# Altium footprint library MainFPs.PcbLib: 215 footprints (part 4 of 14)
Each footprint in its own frame and in the unit in brackets; x right, y up, seen from the top. Pads: shape width x height; smd on the part's side, far side on the other; paste and mask are expansions set on the pad; w line width, h text height; cw(c..) or ccw(c..) is an arc to the next point about the centre after c.
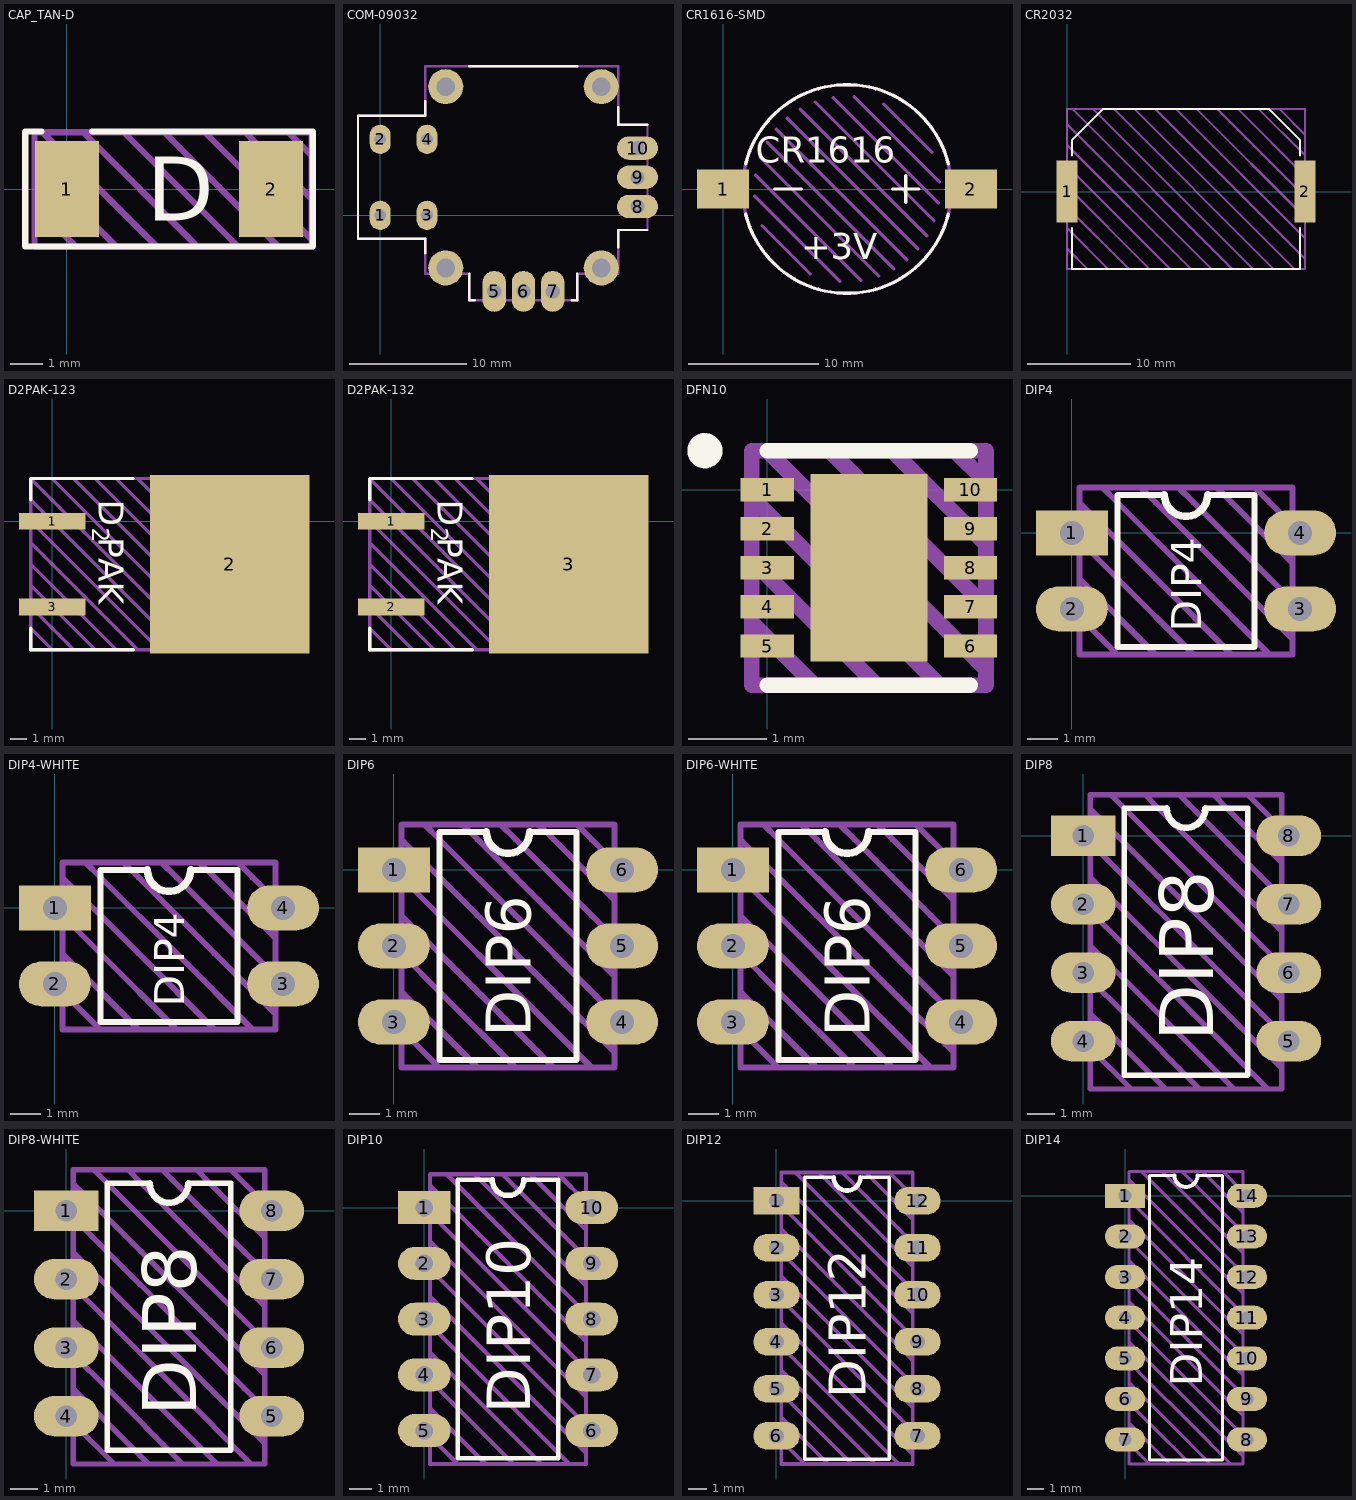
[diagram p3: the footprints below, top view; thin cyan lines are the x and y axes]

## CAP_TAN-D [mm]
pads (2):
  rect 2x3 smd: 1(0,0) 2(6.4,0)
Top Overlay:
  lines w0.2: -0.8,1.8 -1.3,1.8 -1.3,-1.8 7.7,-1.8 7.7,1.8 0.8,1.8
  text "D" at 2.5,-1 h2
Top Draw:
  lines w0.2: -1.016,-0.508 0.276,-1.8 0.508,-1.8 ; -1.016,0.762 1.546,-1.8 1.778,-1.8 ; -0.762,1.778 2.794,-1.778 ; 0.508,1.778 4.086,-1.8 4.318,-1.8 ; 1.778,1.778 5.334,-1.778 ; 3.048,1.778 6.626,-1.8 7.112,-1.8 ; 4.318,1.778 7.678,-1.582 ; 5.588,1.778 7.678,-0.312 ; 6.604,1.778 6.938,1.778 7.689,1.027 ; 7.678,-1.582 7.678,-1.778 7.656,-1.8 -0.994,-1.8 -1.016,-1.778 -1.016,1.778 7.678,1.778 7.678,-1.582
Top Info:
  text "'.Comment'" at -1.049,-3.383 h1
3D body: height 1.8, standoff 0.05, extent -0.2,-1.15 -0.1,1.15
3D body: height 0.05, standoff 0, extent -0.2,-1.15 0.769,1.15
3D body: height 2.9, standoff 0.05, extent -0.1,-1.5 1.5,1.5
3D body: height 2.9, standoff 0.05, extent 1.5,-1.5 6.5,1.5
3D body: height 0.05, standoff 0, extent 5.631,-1.15 6.6,1.15
3D body: height 1.8, standoff 0.05, extent 6.5,-1.15 6.6,1.15

## COM-09032 [mm] "PS3/PS4 Analog Joystick"
pads (14):
  oval 1.8x2.5 hole 1: 1(0,0) 2(0,6.5) 3(4,0) 4(4,6.5)
  oval 2x3.5 hole 1.2: 5(9.75,-6.5) 6(12.25,-6.5) 7(14.75,-6.5)
  oval 3.5x2 hole 1.2: 8(22,0.75) 9(22,3.25) 10(22,5.75)
  round 3 hole 1.6: ""(5.6,-4.5) ""(5.6,11) ""(18.9,-4.5) ""(18.9,11)
Top Overlay:
  lines w0.2: 3.85,-3.25 3.85,-2 -1.9,-2 -1.9,8.5 3.85,8.5 3.85,9.75 ; 7.6,-5 7.6,-7.25 8.1,-7.25 ; 7.6,12.75 16.85,12.75 ; 16.35,-7.25 16.85,-7.25 16.85,-5 ; 20.35,-2.75 20.35,-1.25 22.85,-1.25 ; 20.35,9.25 20.35,7.75 22.85,7.75
Top Draw:
  lines w0.2: -1.9,-2 -1.9,8.5 3.85,8.5 3.85,12.75 7.6,12.75 20.35,12.75 20.35,7.75 22.85,7.75 22.85,-1.25 20.35,-1.25 20.35,-5 16.85,-5 16.85,-7.25 7.6,-7.25 7.6,-5 3.85,-5 3.85,-2 -1.9,-2
Top Info:
  text "'.Comment'" at 2.003,-11.166 h2

## CR1616-SMD [mm]
pads (2):
  rect 4x3 smd: 1(0,0) 2(19,0)
Top Overlay:
  lines w0.25: 1.739,-1.94 ccw(c9.5,0) 17.261,-1.94 ; 1.739,1.94 cw(c9.5,0) 17.261,1.94 ; 3.968,0 6,0 ; 12.984,0 15.016,0 ; 14,-1.016 14,1.016
  text "CR1616" at 2.5,2 h2
  text "+3V" at 6,-5.4 h2
Top Draw:
  circle w0.25: c9.5,0 r8
  lines w0.25: 2.422,-0.559 8.941,-7.078 ; 2.482,1.078 10.578,-7.018 ; 2.828,2.429 11.929,-6.672 ; 2.982,-2.816 6.684,-6.518 ; 3.371,3.584 13.084,-6.129 ; 4.073,4.578 14.078,-5.427 ; 4.922,5.427 14.927,-4.578 ; 5.916,6.129 15.629,-3.584 ; 7.071,6.672 16.172,-2.429 ; 8.422,7.018 16.518,-1.078 ; 10.059,7.078 16.578,0.559 ; 12.316,6.518 16.018,2.816
Top Info:
  text "'.Comment'" at 1.003,-10.666 h2
3D body "cr1616.stp": height 2.1, standoff 0, extent -1.5,-8.095 20.6,8.1

## CR2032 [mm] "Battery Holder Compact"
pads (2):
  rect 2x6 smd: 1(0,0) 2(23,0)
Top Overlay:
  lines w0.2: 0.5,-3.5 0.5,-7.5 22.5,-7.5 22.5,-3.5 ; 0.5,3.5 0.5,5 ; 22.5,3.5 22.5,5 19.5,8 3.5,8 0.5,5 ; 0.5,5 0.5,5
Top Draw:
  lines w0.2: 0,-5.5 2,-7.5 ; 0,-3.5 4,-7.5 ; 0,-1.5 6,-7.5 ; 0,0.5 8,-7.5 ; 0,2.5 10,-7.5 ; 0,4.5 12,-7.5 ; 0,6.5 14,-7.5 ; 0.5,8 16,-7.5 ; 2.5,8 18,-7.5 ; 4.5,8 20,-7.5 ; 6.5,8 22,-7.5 ; 8.5,8 23,-6.5 ; 10.5,8 23,-4.5 ; 12.5,8 23,-2.5 ; 14.5,8 23,-0.5 ; 16.5,8 23,1.5 ; 18.5,8 23,3.5 ; 20.5,8 23,5.5 ; 0,-7.5 0,8 23,8 23,-7.5 0,-7.5
Top Info:
  text "'.Comment'" at 2.603,-10.866 h2
3D body "CR2032_Holder.STEP": height 4.35, standoff 0.05, extent 0.05,-7.625 22.95,7.888

## D2PAK-123 [mm]
height 4.6
pads (3):
  rect 3.95x1 smd: 1(0,0) 3(0,-5.08)
  rect 9.5x10.6 smd: 2(10.541,-2.54)
Top Overlay:
  lines w0.2: -1.27,-6.35 -1.27,-7.62 4.826,-7.62 ; -1.27,1.27 -1.27,2.54 4.826,2.54
  text "2" at 2.379,-0.383 h1
  text "D PAK" at 2.762,1.27 h1.5
Top Draw:
  lines w0.2: -1.27,-6.35 0,-7.62 ; -1.27,-5.08 1.27,-7.62 ; -1.27,-3.81 2.54,-7.62 ; -1.27,-2.54 3.81,-7.62 ; -1.27,-1.27 5.08,-7.62 ; -1.27,0 6.35,-7.62 ; -1.27,1.27 7.62,-7.62 ; 0,2.54 10.16,-7.62 ; 1.27,2.54 11.43,-7.62 ; 2.54,2.54 12.7,-7.62 ; 3.81,2.54 13.97,-7.62 ; 5.08,2.54 14.097,-6.477 ; 6.35,2.54 14.097,-5.207 ; 7.62,2.54 14.097,-3.937 ; 8.89,-7.62 -1.27,2.54 ; 8.89,2.54 14.097,-2.667 ; 10.16,2.54 14.097,-1.397 ; 11.43,2.54 14.097,-0.127 ; 12.7,2.54 14.097,1.143 ; -1.27,2.54 14.097,2.54 14.097,-7.62 -1.27,-7.62 -1.27,2.54
Top Info:
  text "'.Comment'" at 1.339,-9.979 h1.25
3D body "D2PAK.step": height 4.7, standoff 0, extent -1.329,-7.69 14.096,2.61

## D2PAK-132 [mm]
height 4.6
pads (3):
  rect 3.95x1 smd: 1(0,0) 2(0,-5.08)
  rect 9.5x10.6 smd: 3(10.541,-2.54)
Top Overlay:
  lines w0.2: -1.27,-6.35 -1.27,-7.62 4.826,-7.62 ; -1.27,1.27 -1.27,2.54 4.826,2.54
  text "2" at 2.379,-0.383 h1
  text "D PAK" at 2.762,1.27 h1.5
Top Draw:
  lines w0.2: -1.27,-6.35 0,-7.62 ; -1.27,-5.08 1.27,-7.62 ; -1.27,-3.81 2.54,-7.62 ; -1.27,-2.54 3.81,-7.62 ; -1.27,-1.27 5.08,-7.62 ; -1.27,0 6.35,-7.62 ; -1.27,1.27 7.62,-7.62 ; 0,2.54 10.16,-7.62 ; 1.27,2.54 11.43,-7.62 ; 2.54,2.54 12.7,-7.62 ; 3.81,2.54 13.97,-7.62 ; 5.08,2.54 14.097,-6.477 ; 6.35,2.54 14.097,-5.207 ; 7.62,2.54 14.097,-3.937 ; 8.89,-7.62 -1.27,2.54 ; 8.89,2.54 14.097,-2.667 ; 10.16,2.54 14.097,-1.397 ; 11.43,2.54 14.097,-0.127 ; 12.7,2.54 14.097,1.143 ; -1.27,2.54 14.097,2.54 14.097,-7.62 -1.27,-7.62 -1.27,2.54
Top Info:
  text "'.Comment'" at 1.339,-9.979 h1.25
3D body "D2PAK.step": height 4.7, standoff 0, extent -1.329,-7.69 14.096,2.61

## DFN10 [mm]
pads (11):
  rect 0.68x0.3 smd: 1(0,0) 2(0,-0.5) 3(0,-1) 4(0,-1.5) 5(0,-2) 6(2.6,-2) 7(2.6,-1.5) 8(2.6,-1) 9(2.6,-0.5) 10(2.6,0)
  rect 1.5x2.4 smd: ""(1.3,-1)
Top Overlay:
  circle w0.25: c-0.8,0.5 r0.1
  lines w0.2: 0,-2.5 2.6,-2.5 ; 0,0.5 2.6,0.5
Top Draw:
  lines w0.2: -0.2,-1.7 0.6,-2.5 ; -0.2,-0.9 1.4,-2.5 ; -0.2,-0.1 2.2,-2.5 ; 0,0.5 2.8,-2.3 ; 0.8,0.5 2.8,-1.5 ; 1.6,0.5 2.8,-0.7 ; 2.4,0.5 2.8,0.1 ; -0.2,-2.5 -0.2,0.5 2.8,0.5 2.8,-2.5 -0.2,-2.5
Top Info:
  text "'.Comment'" at -0.824,-3.292 h0.5
3D body "PSON50P300X100_HS-11N.step": height 1, standoff 0, extent -0.201,-2.5 2.801,0.5

## DIP4 [mm]
pads (4):
  rect 2.4x1.5 hole 0.8: 1(0,0)
  oval 2.4x1.5 hole 0.8: 2(0,-2.54) 3(7.62,-2.54) 4(7.62,0)
Top Overlay:
  lines w0.2: 3.048,1.27 1.524,1.27 1.524,-3.81 6.096,-3.81 6.096,1.27 4.572,1.27
  lines w0.25: 3.092,1.27 ccw(c3.81,1.27) 4.528,1.27
  text "DIP4" at 4.318,-3.302 h1
Top Draw:
  lines w0.2: 0.254,-2.794 1.524,-4.064 ; 0.254,-1.524 2.794,-4.064 ; 0.254,-0.254 1.524,-1.524 4.064,-4.064 ; 0.254,1.016 2.794,-1.524 5.334,-4.064 ; 3.556,1.524 4.064,1.016 6.604,-1.524 7.366,-2.286 ; 4.826,1.524 5.334,1.016 7.366,-1.016 ; 6.096,1.524 6.604,1.016 7.366,0.254 ; 6.604,-4.064 4.064,-1.524 1.524,1.016 1.016,1.524 2.286,1.524 2.794,1.016 5.334,-1.524 7.366,-3.556 ; 0.254,-4.064 0.254,1.524 7.366,1.524 7.366,-4.064 0.254,-4.064
Top Info:
  text "'.Comment'" at -0.381,-5.461 h1
3D body: height 2, standoff 0.25, extent 0.508,-3.81 7.112,1.27
3D body: height 3, standoff 2, extent 0.508,-3.81 7.112,1.27
3D body: height 2.09, standoff 0.31, extent -0.127,-0.5 0.508,0.5
3D body: height 0.38, standoff -3, extent -0.127,-0.254 0.127,0.254
3D body: height 2.09, standoff 0.31, extent -0.127,-3.04 0.508,-2.04
3D body: height 0.38, standoff -3, extent -0.127,-2.794 0.127,-2.286
3D body: height 2.09, standoff 0.31, extent 7.112,-3.04 7.747,-2.04
3D body: height 0.38, standoff -3, extent 7.493,-2.794 7.747,-2.286
3D body: height 2.09, standoff 0.31, extent 7.112,-0.5 7.747,0.5
3D body: height 0.38, standoff -3, extent 7.493,-0.254 7.747,0.254

## DIP4-WHITE [mm]
pads (4):
  rect 2.4x1.5 hole 0.8: 1(0,0)
  oval 2.4x1.5 hole 0.8: 2(0,-2.54) 3(7.62,-2.54) 4(7.62,0)
Top Overlay:
  lines w0.2: 3.048,1.27 1.524,1.27 1.524,-3.81 6.096,-3.81 6.096,1.27 4.572,1.27
  lines w0.25: 3.092,1.27 ccw(c3.81,1.27) 4.528,1.27
  text "DIP4" at 4.318,-3.302 h1
Top Draw:
  lines w0.2: 0.254,-2.794 1.524,-4.064 ; 0.254,-1.524 2.794,-4.064 ; 0.254,-0.254 1.524,-1.524 4.064,-4.064 ; 0.254,1.016 2.794,-1.524 5.334,-4.064 ; 3.556,1.524 4.064,1.016 6.604,-1.524 7.366,-2.286 ; 4.826,1.524 5.334,1.016 7.366,-1.016 ; 6.096,1.524 6.604,1.016 7.366,0.254 ; 6.604,-4.064 4.064,-1.524 1.524,1.016 1.016,1.524 2.286,1.524 2.794,1.016 5.334,-1.524 7.366,-3.556 ; 0.254,-4.064 7.366,-4.064 7.366,1.524 0.254,1.524 0.254,-4.064
Top Info:
  text "'.Comment'" at -0.381,-5.461 h1
3D body: height 0.38, standoff -3, extent 7.493,-0.254 7.747,0.254
3D body: height 2.09, standoff 0.31, extent 7.112,-0.5 7.747,0.5
3D body: height 0.38, standoff -3, extent 7.493,-2.794 7.747,-2.286
3D body: height 2.09, standoff 0.31, extent 7.112,-3.04 7.747,-2.04
3D body: height 0.38, standoff -3, extent -0.127,-2.794 0.127,-2.286
3D body: height 2.09, standoff 0.31, extent -0.127,-3.04 0.508,-2.04
3D body: height 0.38, standoff -3, extent -0.127,-0.254 0.127,0.254
3D body: height 2.09, standoff 0.31, extent -0.127,-0.5 0.508,0.5
3D body: height 3, standoff 2, extent 0.508,-3.81 7.112,1.27
3D body: height 2, standoff 0.25, extent 0.508,-3.81 7.112,1.27

## DIP6 [mm]
pads (6):
  rect 2.4x1.5 hole 0.8: 1(0,0)
  oval 2.4x1.5 hole 0.8: 2(0,-2.54) 3(0,-5.08) 4(7.62,-5.08) 5(7.62,-2.54) 6(7.62,0)
Top Overlay:
  lines w0.2: 3.048,1.27 1.524,1.27 1.524,-6.35 6.096,-6.35 6.096,1.27 4.572,1.27
  lines w0.25: 3.092,1.27 ccw(c3.81,1.27) 4.528,1.27
  text "DIP6" at 4.572,-5.588 h1.5
Top Draw:
  lines w0.2: 0.254,-5.334 1.524,-6.604 ; 0.254,-4.064 2.794,-6.604 ; 0.254,-2.794 1.524,-4.064 4.064,-6.604 ; 0.254,-1.524 2.794,-4.064 5.334,-6.604 ; 0.254,-0.254 1.524,-1.524 4.064,-4.064 6.604,-6.604 ; 0.254,1.016 2.794,-1.524 5.334,-4.064 7.366,-6.096 ; 3.556,1.524 4.064,1.016 6.604,-1.524 7.366,-2.286 ; 4.826,1.524 5.334,1.016 7.366,-1.016 ; 6.096,1.524 6.604,1.016 7.366,0.254 ; 7.366,-4.826 6.604,-4.064 4.064,-1.524 1.524,1.016 1.016,1.524 2.286,1.524 2.794,1.016 5.334,-1.524 7.366,-3.556 ; 0.254,-6.604 7.366,-6.604 7.366,1.524 0.254,1.524 0.254,-6.604
Top Info:
  text "'.Comment'" at -0.381,-8.001 h1
3D body: height 0.38, standoff -3, extent 7.493,-0.254 7.747,0.254
3D body: height 2.09, standoff 0.31, extent 7.112,-0.5 7.747,0.5
3D body: height 0.38, standoff -3, extent 7.493,-2.794 7.747,-2.286
3D body: height 2.09, standoff 0.31, extent 7.112,-3.04 7.747,-2.04
3D body: height 0.38, standoff -3, extent 7.493,-5.334 7.747,-4.826
3D body: height 2.09, standoff 0.31, extent 7.112,-5.58 7.747,-4.58
3D body: height 0.38, standoff -3, extent -0.127,-5.334 0.127,-4.826
3D body: height 2.09, standoff 0.31, extent -0.127,-5.58 0.508,-4.58
3D body: height 0.38, standoff -3, extent -0.127,-2.794 0.127,-2.286
3D body: height 2.09, standoff 0.31, extent -0.127,-3.04 0.508,-2.04
3D body: height 0.38, standoff -3, extent -0.127,-0.254 0.127,0.254
3D body: height 2.09, standoff 0.31, extent -0.127,-0.5 0.508,0.5
3D body: height 3, standoff 2, extent 0.508,-6.35 7.112,1.27
3D body: height 2, standoff 0.25, extent 0.508,-6.35 7.112,1.27

## DIP6-WHITE [mm]
pads (6):
  rect 2.4x1.5 hole 0.8: 1(0,0)
  oval 2.4x1.5 hole 0.8: 2(0,-2.54) 3(0,-5.08) 4(7.62,-5.08) 5(7.62,-2.54) 6(7.62,0)
Top Overlay:
  lines w0.2: 3.048,1.27 1.524,1.27 1.524,-6.35 6.096,-6.35 6.096,1.27 4.572,1.27
  lines w0.25: 3.092,1.27 ccw(c3.81,1.27) 4.528,1.27
  text "DIP6" at 4.572,-5.588 h1.5
Top Draw:
  lines w0.2: 0.254,-5.334 1.524,-6.604 ; 0.254,-4.064 2.794,-6.604 ; 0.254,-2.794 1.524,-4.064 4.064,-6.604 ; 0.254,-1.524 2.794,-4.064 5.334,-6.604 ; 0.254,-0.254 1.524,-1.524 4.064,-4.064 6.604,-6.604 ; 0.254,1.016 2.794,-1.524 5.334,-4.064 7.366,-6.096 ; 3.556,1.524 4.064,1.016 6.604,-1.524 7.366,-2.286 ; 4.826,1.524 5.334,1.016 7.366,-1.016 ; 6.096,1.524 6.604,1.016 7.366,0.254 ; 7.366,-4.826 6.604,-4.064 4.064,-1.524 1.524,1.016 1.016,1.524 2.286,1.524 2.794,1.016 5.334,-1.524 7.366,-3.556 ; 0.254,-6.604 0.254,1.524 7.366,1.524 7.366,-6.604 0.254,-6.604
Top Info:
  text "'.Comment'" at -0.381,-8.001 h1
3D body: height 2, standoff 0.25, extent 0.508,-6.35 7.112,1.27
3D body: height 3, standoff 2, extent 0.508,-6.35 7.112,1.27
3D body: height 2.09, standoff 0.31, extent -0.127,-0.5 0.508,0.5
3D body: height 0.38, standoff -3, extent -0.127,-0.254 0.127,0.254
3D body: height 2.09, standoff 0.31, extent -0.127,-3.04 0.508,-2.04
3D body: height 0.38, standoff -3, extent -0.127,-2.794 0.127,-2.286
3D body: height 2.09, standoff 0.31, extent -0.127,-5.58 0.508,-4.58
3D body: height 0.38, standoff -3, extent -0.127,-5.334 0.127,-4.826
3D body: height 2.09, standoff 0.31, extent 7.112,-5.58 7.747,-4.58
3D body: height 0.38, standoff -3, extent 7.493,-5.334 7.747,-4.826
3D body: height 2.09, standoff 0.31, extent 7.112,-3.04 7.747,-2.04
3D body: height 0.38, standoff -3, extent 7.493,-2.794 7.747,-2.286
3D body: height 2.09, standoff 0.31, extent 7.112,-0.5 7.747,0.5
3D body: height 0.38, standoff -3, extent 7.493,-0.254 7.747,0.254

## DIP8 [mm]
pads (8):
  rect 2.4x1.5 hole 0.8: 1(0,0)
  oval 2.4x1.5 hole 0.8: 2(0,-2.54) 3(0,-5.08) 4(0,-7.62) 5(7.62,-7.62) 6(7.62,-5.08) 7(7.62,-2.54) 8(7.62,0)
Top Overlay:
  lines w0.2: 3.048,1.016 1.524,1.016 1.524,-8.89 6.096,-8.89 6.096,1.016 4.572,1.016
  lines w0.25: 3.092,1.016 ccw(c3.81,1.016) 4.528,1.016
  text "DIP8" at 4.826,-7.62 h2
Top Draw:
  lines w0.2: 0.254,-7.874 1.778,-9.398 ; 0.254,-6.604 3.048,-9.398 ; 0.254,-5.334 1.524,-6.604 4.318,-9.398 ; 0.254,-4.064 2.794,-6.604 5.588,-9.398 ; 0.254,-2.794 1.524,-4.064 4.064,-6.604 6.858,-9.398 ; 0.254,-1.524 2.794,-4.064 5.334,-6.604 7.366,-8.636 ; 0.254,-0.254 1.524,-1.524 4.064,-4.064 6.604,-6.604 7.366,-7.366 ; 0.254,1.016 2.794,-1.524 5.334,-4.064 7.366,-6.096 ; 1.016,1.524 1.524,1.016 4.064,-1.524 6.604,-4.064 7.366,-4.826 ; 2.286,1.524 2.794,1.016 5.334,-1.524 7.366,-3.556 ; 3.556,1.524 4.064,1.016 6.604,-1.524 7.366,-2.286 ; 4.826,1.524 5.334,1.016 7.366,-1.016 ; 6.096,1.524 6.604,1.016 7.366,0.254 ; 0.254,-9.398 7.366,-9.398 7.366,1.524 0.254,1.524 0.254,-9.398
Top Info:
  text "'.Comment'" at -0.381,-10.795 h1
3D body: height 2.09, standoff 0.31, extent -0.127,-5.58 0.508,-4.58
3D body: height 0.38, standoff -3, extent -0.127,-5.334 0.127,-4.826
3D body: height 2.09, standoff 0.31, extent -0.127,-8.12 0.508,-7.12
3D body: height 0.38, standoff -3, extent -0.127,-7.874 0.127,-7.366
3D body: height 2.09, standoff 0.31, extent 7.112,-8.12 7.747,-7.12
3D body: height 0.38, standoff -3, extent 7.493,-7.874 7.747,-7.366
3D body: height 2.09, standoff 0.31, extent 7.112,-5.58 7.747,-4.58
3D body: height 0.38, standoff -3, extent 7.493,-5.334 7.747,-4.826
3D body: height 2.09, standoff 0.31, extent -0.127,-0.5 0.508,0.5
3D body: height 0.38, standoff -3, extent -0.127,-0.254 0.127,0.254
3D body: height 2.09, standoff 0.31, extent -0.127,-3.04 0.508,-2.04
3D body: height 0.38, standoff -3, extent -0.127,-2.794 0.127,-2.286
3D body: height 2.09, standoff 0.31, extent 7.112,-3.04 7.747,-2.04
3D body: height 0.38, standoff -3, extent 7.493,-2.794 7.747,-2.286
3D body: height 2.09, standoff 0.31, extent 7.112,-0.5 7.747,0.5
3D body: height 0.38, standoff -3, extent 7.493,-0.254 7.747,0.254
3D body: height 3, standoff 2, extent 0.508,-8.89 7.112,1.27
3D body: height 2.03, standoff 0.25, extent 0.508,-8.89 7.112,1.27

## DIP8-WHITE [mm]
pads (8):
  rect 2.4x1.5 hole 0.8: 1(0,0)
  oval 2.4x1.5 hole 0.8: 2(0,-2.54) 3(0,-5.08) 4(0,-7.62) 5(7.62,-7.62) 6(7.62,-5.08) 7(7.62,-2.54) 8(7.62,0)
Top Overlay:
  lines w0.2: 3.048,1.016 1.524,1.016 1.524,-8.89 6.096,-8.89 6.096,1.016 4.572,1.016
  lines w0.25: 3.092,1.016 ccw(c3.81,1.016) 4.528,1.016
  text "DIP8" at 4.826,-7.62 h2
Top Draw:
  lines w0.2: 0.254,-7.874 1.778,-9.398 ; 0.254,-6.604 3.048,-9.398 ; 0.254,-5.334 1.524,-6.604 4.318,-9.398 ; 0.254,-4.064 2.794,-6.604 5.588,-9.398 ; 0.254,-2.794 1.524,-4.064 4.064,-6.604 6.858,-9.398 ; 0.254,-1.524 2.794,-4.064 5.334,-6.604 7.366,-8.636 ; 0.254,-0.254 1.524,-1.524 4.064,-4.064 6.604,-6.604 7.366,-7.366 ; 0.254,1.016 2.794,-1.524 5.334,-4.064 7.366,-6.096 ; 1.016,1.524 1.524,1.016 4.064,-1.524 6.604,-4.064 7.366,-4.826 ; 2.286,1.524 2.794,1.016 5.334,-1.524 7.366,-3.556 ; 3.556,1.524 4.064,1.016 6.604,-1.524 7.366,-2.286 ; 4.826,1.524 5.334,1.016 7.366,-1.016 ; 6.096,1.524 6.604,1.016 7.366,0.254 ; 0.254,-9.398 0.254,1.524 7.366,1.524 7.366,-9.398 0.254,-9.398
Top Info:
  text "'.Comment'" at -0.381,-10.795 h1
3D body: height 2.03, standoff 0.25, extent 0.508,-8.89 7.112,1.27
3D body: height 3, standoff 2, extent 0.508,-8.89 7.112,1.27
3D body: height 0.38, standoff -3, extent 7.493,-0.254 7.747,0.254
3D body: height 2.09, standoff 0.31, extent 7.112,-0.5 7.747,0.5
3D body: height 0.38, standoff -3, extent 7.493,-2.794 7.747,-2.286
3D body: height 2.09, standoff 0.31, extent 7.112,-3.04 7.747,-2.04
3D body: height 0.38, standoff -3, extent -0.127,-2.794 0.127,-2.286
3D body: height 2.09, standoff 0.31, extent -0.127,-3.04 0.508,-2.04
3D body: height 0.38, standoff -3, extent -0.127,-0.254 0.127,0.254
3D body: height 2.09, standoff 0.31, extent -0.127,-0.5 0.508,0.5
3D body: height 0.38, standoff -3, extent 7.493,-5.334 7.747,-4.826
3D body: height 2.09, standoff 0.31, extent 7.112,-5.58 7.747,-4.58
3D body: height 0.38, standoff -3, extent 7.493,-7.874 7.747,-7.366
3D body: height 2.09, standoff 0.31, extent 7.112,-8.12 7.747,-7.12
3D body: height 0.38, standoff -3, extent -0.127,-7.874 0.127,-7.366
3D body: height 2.09, standoff 0.31, extent -0.127,-8.12 0.508,-7.12
3D body: height 0.38, standoff -3, extent -0.127,-5.334 0.127,-4.826
3D body: height 2.09, standoff 0.31, extent -0.127,-5.58 0.508,-4.58

## DIP10 [mm]
pads (10):
  rect 2.4x1.5 hole 0.8: 1(0,0)
  oval 2.4x1.5 hole 0.8: 2(0,-2.54) 3(0,-5.08) 4(0,-7.62) 5(0,-10.16) 6(7.62,-10.16) 7(7.62,-7.62) 8(7.62,-5.08) 9(7.62,-2.54) 10(7.62,0)
Top Overlay:
  lines w0.2: 3.048,1.27 1.524,1.27 1.524,-11.43 6.096,-11.43 6.096,1.27 4.572,1.27
  lines w0.25: 3.092,1.27 ccw(c3.81,1.27) 4.528,1.27
  text "DIP10" at 4.826,-9.398 h2
Top Draw:
  lines w0.2: 0.254,-10.414 1.524,-11.684 ; 0.254,-9.144 2.794,-11.684 ; 0.254,-7.874 4.064,-11.684 ; 0.254,-6.604 5.334,-11.684 ; 0.254,-5.334 6.604,-11.684 ; 0.254,-4.064 7.366,-11.176 ; 0.254,-2.794 7.366,-9.906 ; 0.254,-1.524 7.366,-8.636 7.366,-7.366 0.254,-0.254 0.254,1.016 7.366,-6.096 7.366,-4.826 1.016,1.524 2.286,1.524 7.366,-3.556 7.366,-2.286 3.556,1.524 4.826,1.524 7.366,-1.016 7.366,0.254 6.096,1.524 ; 0.254,-11.684 0.254,1.524 7.366,1.524 7.366,-11.684 0.254,-11.684
Top Info:
  text "'.Comment'" at -0.381,-13.081 h1
3D body: height 2.03, standoff 0.25, extent 0.508,-11.43 7.112,1.27
3D body: height 3, standoff 2, extent 0.508,-11.43 7.112,1.27
3D body: height 0.38, standoff -3, extent 7.493,-0.254 7.747,0.254
3D body: height 2.09, standoff 0.31, extent 7.112,-0.5 7.747,0.5
3D body: height 0.38, standoff -3, extent 7.493,-2.794 7.747,-2.286
3D body: height 2.09, standoff 0.31, extent 7.112,-3.04 7.747,-2.04
3D body: height 0.38, standoff -3, extent -0.127,-2.794 0.127,-2.286
3D body: height 2.09, standoff 0.31, extent -0.127,-3.04 0.508,-2.04
3D body: height 0.38, standoff -3, extent -0.127,-0.254 0.127,0.254
3D body: height 2.09, standoff 0.31, extent -0.127,-0.5 0.508,0.5
3D body: height 0.38, standoff -3, extent 7.493,-5.334 7.747,-4.826
3D body: height 2.09, standoff 0.31, extent 7.112,-5.58 7.747,-4.58
3D body: height 0.38, standoff -3, extent 7.493,-7.874 7.747,-7.366
3D body: height 2.09, standoff 0.31, extent 7.112,-8.12 7.747,-7.12
3D body: height 0.38, standoff -3, extent -0.127,-7.874 0.127,-7.366
3D body: height 2.09, standoff 0.31, extent -0.127,-8.12 0.508,-7.12
3D body: height 0.38, standoff -3, extent -0.127,-5.334 0.127,-4.826
3D body: height 2.09, standoff 0.31, extent -0.127,-5.58 0.508,-4.58
3D body: height 0.38, standoff -3, extent 7.493,-10.414 7.747,-9.906
3D body: height 2.09, standoff 0.31, extent 7.112,-10.66 7.747,-9.66
3D body: height 0.38, standoff -3, extent -0.127,-10.414 0.127,-9.906
3D body: height 2.09, standoff 0.31, extent -0.127,-10.66 0.508,-9.66

## DIP12 [mm]
pads (12):
  rect 2.5x1.5 hole 0.8: 1(0,0)
  oval 2.5x1.5 hole 0.8: 2(0,-2.54) 3(0,-5.08) 4(0,-7.62) 5(0,-10.16) 6(0,-12.7) 7(7.62,-12.7) 8(7.62,-10.16) 9(7.62,-7.62) 10(7.62,-5.08) 11(7.62,-2.54) 12(7.62,0)
Top Overlay:
  lines w0.2: 3.048,1.27 1.524,1.27 1.524,-13.97 6.096,-13.97 6.096,1.27 4.572,1.27
  lines w0.25: 3.092,1.27 ccw(c3.81,1.27) 4.528,1.27
  text "DIP12" at 4.826,-10.668 h2
Top Draw:
  lines w0.2: 0.254,-12.954 1.524,-14.224 ; 0.254,-11.684 2.794,-14.224 4.064,-14.224 ; 0.254,-10.414 1.524,-11.684 ; 0.254,-9.144 2.794,-11.684 ; 0.254,-7.874 4.064,-11.684 6.604,-14.224 5.334,-14.224 ; 0.254,-6.604 5.334,-11.684 7.366,-13.716 ; 0.254,-5.334 6.604,-11.684 7.366,-12.446 ; 0.254,-4.064 7.366,-11.176 ; 0.254,-2.794 7.366,-9.906 ; 0.254,-1.524 7.366,-8.636 ; 0.254,-0.254 7.366,-7.366 ; 0.254,1.016 7.366,-6.096 ; 1.016,1.524 7.366,-4.826 ; 2.286,1.524 7.366,-3.556 ; 3.556,1.524 7.366,-2.286 ; 4.826,1.524 7.366,-1.016 ; 6.096,1.524 7.366,0.254 ; 2.794,-11.684 5.334,-14.224 ; 2.794,-11.684 5.334,-14.224 ; 4.064,-14.224 5.334,-14.224 ; 4.064,-14.224 1.27,-11.43 4.064,-14.224 ; 0.254,-14.224 0.254,1.524 7.366,1.524 7.366,-14.224 0.254,-14.224
Top Info:
  text "'.Comment'" at -0.381,-15.621 h1
3D body: height 2.03, standoff 0.25, extent 0.508,-13.97 7.112,1.27
3D body: height 3, standoff 2, extent 0.508,-13.97 7.112,1.27
3D body: height 0.38, standoff -3, extent 7.493,-0.254 7.747,0.254
3D body: height 2.09, standoff 0.31, extent 7.112,-0.5 7.747,0.5
3D body: height 0.38, standoff -3, extent 7.493,-2.794 7.747,-2.286
3D body: height 2.09, standoff 0.31, extent 7.112,-3.04 7.747,-2.04
3D body: height 0.38, standoff -3, extent -0.127,-2.794 0.127,-2.286
3D body: height 2.09, standoff 0.31, extent -0.127,-3.04 0.508,-2.04
3D body: height 0.38, standoff -3, extent -0.127,-0.254 0.127,0.254
3D body: height 2.09, standoff 0.31, extent -0.127,-0.5 0.508,0.5
3D body: height 0.38, standoff -3, extent 7.493,-5.334 7.747,-4.826
3D body: height 2.09, standoff 0.31, extent 7.112,-5.58 7.747,-4.58
3D body: height 0.38, standoff -3, extent 7.493,-7.874 7.747,-7.366
3D body: height 2.09, standoff 0.31, extent 7.112,-8.12 7.747,-7.12
3D body: height 0.38, standoff -3, extent -0.127,-7.874 0.127,-7.366
3D body: height 2.09, standoff 0.31, extent -0.127,-8.12 0.508,-7.12
3D body: height 0.38, standoff -3, extent -0.127,-5.334 0.127,-4.826
3D body: height 2.09, standoff 0.31, extent -0.127,-5.58 0.508,-4.58
3D body: height 0.38, standoff -3, extent 7.493,-10.414 7.747,-9.906
3D body: height 2.09, standoff 0.31, extent 7.112,-10.66 7.747,-9.66
3D body: height 0.38, standoff -3, extent 7.493,-12.954 7.747,-12.446
3D body: height 2.09, standoff 0.31, extent 7.112,-13.2 7.747,-12.2
3D body: height 0.38, standoff -3, extent -0.127,-12.954 0.127,-12.446
3D body: height 2.09, standoff 0.31, extent -0.127,-13.2 0.508,-12.2
3D body: height 0.38, standoff -3, extent -0.127,-10.414 0.127,-9.906
3D body: height 2.09, standoff 0.31, extent -0.127,-10.66 0.508,-9.66

## DIP14 [mm]
pads (14):
  rect 2.5x1.5 hole 0.8: 1(0,0)
  oval 2.5x1.5 hole 0.8: 2(0,-2.54) 3(0,-5.08) 4(0,-7.62) 5(0,-10.16) 6(0,-12.7) 7(0,-15.24) 8(7.62,-15.24) 9(7.62,-12.7) 10(7.62,-10.16) 11(7.62,-7.62) 12(7.62,-5.08) 13(7.62,-2.54) 14(7.62,0)
Top Overlay:
  lines w0.2: 3.048,1.27 1.524,1.27 1.524,-16.51 6.096,-16.51 6.096,1.27 4.572,1.27
  lines w0.25: 3.092,1.27 ccw(c3.81,1.27) 4.528,1.27
  text "DIP14" at 4.826,-11.938 h2
Top Draw:
  lines w0.2: 0.254,-15.494 1.524,-16.764 ; 0.254,-14.224 2.794,-16.764 ; 0.254,-12.954 1.524,-14.224 4.064,-16.764 ; 0.254,-11.684 2.794,-14.224 5.334,-16.764 ; 0.254,-10.414 1.524,-11.684 ; 0.254,-9.144 2.794,-11.684 ; 0.254,-7.874 4.064,-11.684 6.604,-14.224 7.366,-14.986 ; 0.254,-6.604 5.334,-11.684 7.366,-13.716 ; 0.254,-5.334 6.604,-11.684 7.366,-12.446 ; 0.254,-4.064 7.366,-11.176 ; 0.254,-2.794 7.366,-9.906 ; 0.254,-1.524 7.366,-8.636 ; 0.254,-0.254 7.366,-7.366 ; 0.254,1.016 7.366,-6.096 ; 1.016,1.524 7.366,-4.826 ; 2.286,1.524 7.366,-3.556 ; 3.556,1.524 7.366,-2.286 ; 4.826,1.524 7.366,-1.016 ; 6.096,1.524 7.366,0.254 ; 6.604,-16.764 4.064,-14.224 ; 7.366,-16.256 5.334,-14.224 ; 2.794,-11.684 5.334,-14.224 ; 2.794,-11.684 5.334,-14.224 ; 4.064,-14.224 1.27,-11.43 4.064,-14.224 ; 0.254,-16.764 7.366,-16.764 7.366,1.524 0.254,1.524 0.254,-16.764
Top Info:
  text "'.Comment'" at -0.381,-18.161 h1
3D body: height 2.09, standoff 0.31, extent -0.127,-15.74 0.508,-14.74
3D body: height 0.38, standoff -3, extent -0.127,-15.494 0.127,-14.986
3D body: height 2.09, standoff 0.31, extent 7.112,-15.74 7.747,-14.74
3D body: height 0.38, standoff -3, extent 7.493,-15.494 7.747,-14.986
3D body: height 2.09, standoff 0.31, extent -0.127,-10.66 0.508,-9.66
3D body: height 0.38, standoff -3, extent -0.127,-10.414 0.127,-9.906
3D body: height 2.09, standoff 0.31, extent -0.127,-13.2 0.508,-12.2
3D body: height 0.38, standoff -3, extent -0.127,-12.954 0.127,-12.446
3D body: height 2.09, standoff 0.31, extent 7.112,-13.2 7.747,-12.2
3D body: height 0.38, standoff -3, extent 7.493,-12.954 7.747,-12.446
3D body: height 2.09, standoff 0.31, extent 7.112,-10.66 7.747,-9.66
3D body: height 0.38, standoff -3, extent 7.493,-10.414 7.747,-9.906
3D body: height 2.09, standoff 0.31, extent -0.127,-5.58 0.508,-4.58
3D body: height 0.38, standoff -3, extent -0.127,-5.334 0.127,-4.826
3D body: height 2.09, standoff 0.31, extent -0.127,-8.12 0.508,-7.12
3D body: height 0.38, standoff -3, extent -0.127,-7.874 0.127,-7.366
3D body: height 2.09, standoff 0.31, extent 7.112,-8.12 7.747,-7.12
3D body: height 0.38, standoff -3, extent 7.493,-7.874 7.747,-7.366
3D body: height 2.09, standoff 0.31, extent 7.112,-5.58 7.747,-4.58
3D body: height 0.38, standoff -3, extent 7.493,-5.334 7.747,-4.826
3D body: height 2.09, standoff 0.31, extent -0.127,-0.5 0.508,0.5
3D body: height 0.38, standoff -3, extent -0.127,-0.254 0.127,0.254
3D body: height 2.09, standoff 0.31, extent -0.127,-3.04 0.508,-2.04
3D body: height 0.38, standoff -3, extent -0.127,-2.794 0.127,-2.286
3D body: height 2.09, standoff 0.31, extent 7.112,-3.04 7.747,-2.04
3D body: height 0.38, standoff -3, extent 7.493,-2.794 7.747,-2.286
3D body: height 2.09, standoff 0.31, extent 7.112,-0.5 7.747,0.5
3D body: height 0.38, standoff -3, extent 7.493,-0.254 7.747,0.254
3D body: height 3, standoff 2, extent 0.508,-16.51 7.112,1.27
3D body: height 2.03, standoff 0.25, extent 0.508,-16.51 7.112,1.27